# Altium footprint library TranDangKhoa-LIB.PcbLib: 1435 footprints (part 16 of 90)
Each footprint in its own frame and in the unit in brackets; x right, y up, seen from the top. Pads: shape width x height; smd on the part's side, far side on the other; paste and mask are expansions set on the pad; w line width, h text height; cw(c..) or ccw(c..) is an arc to the next point about the centre after c.
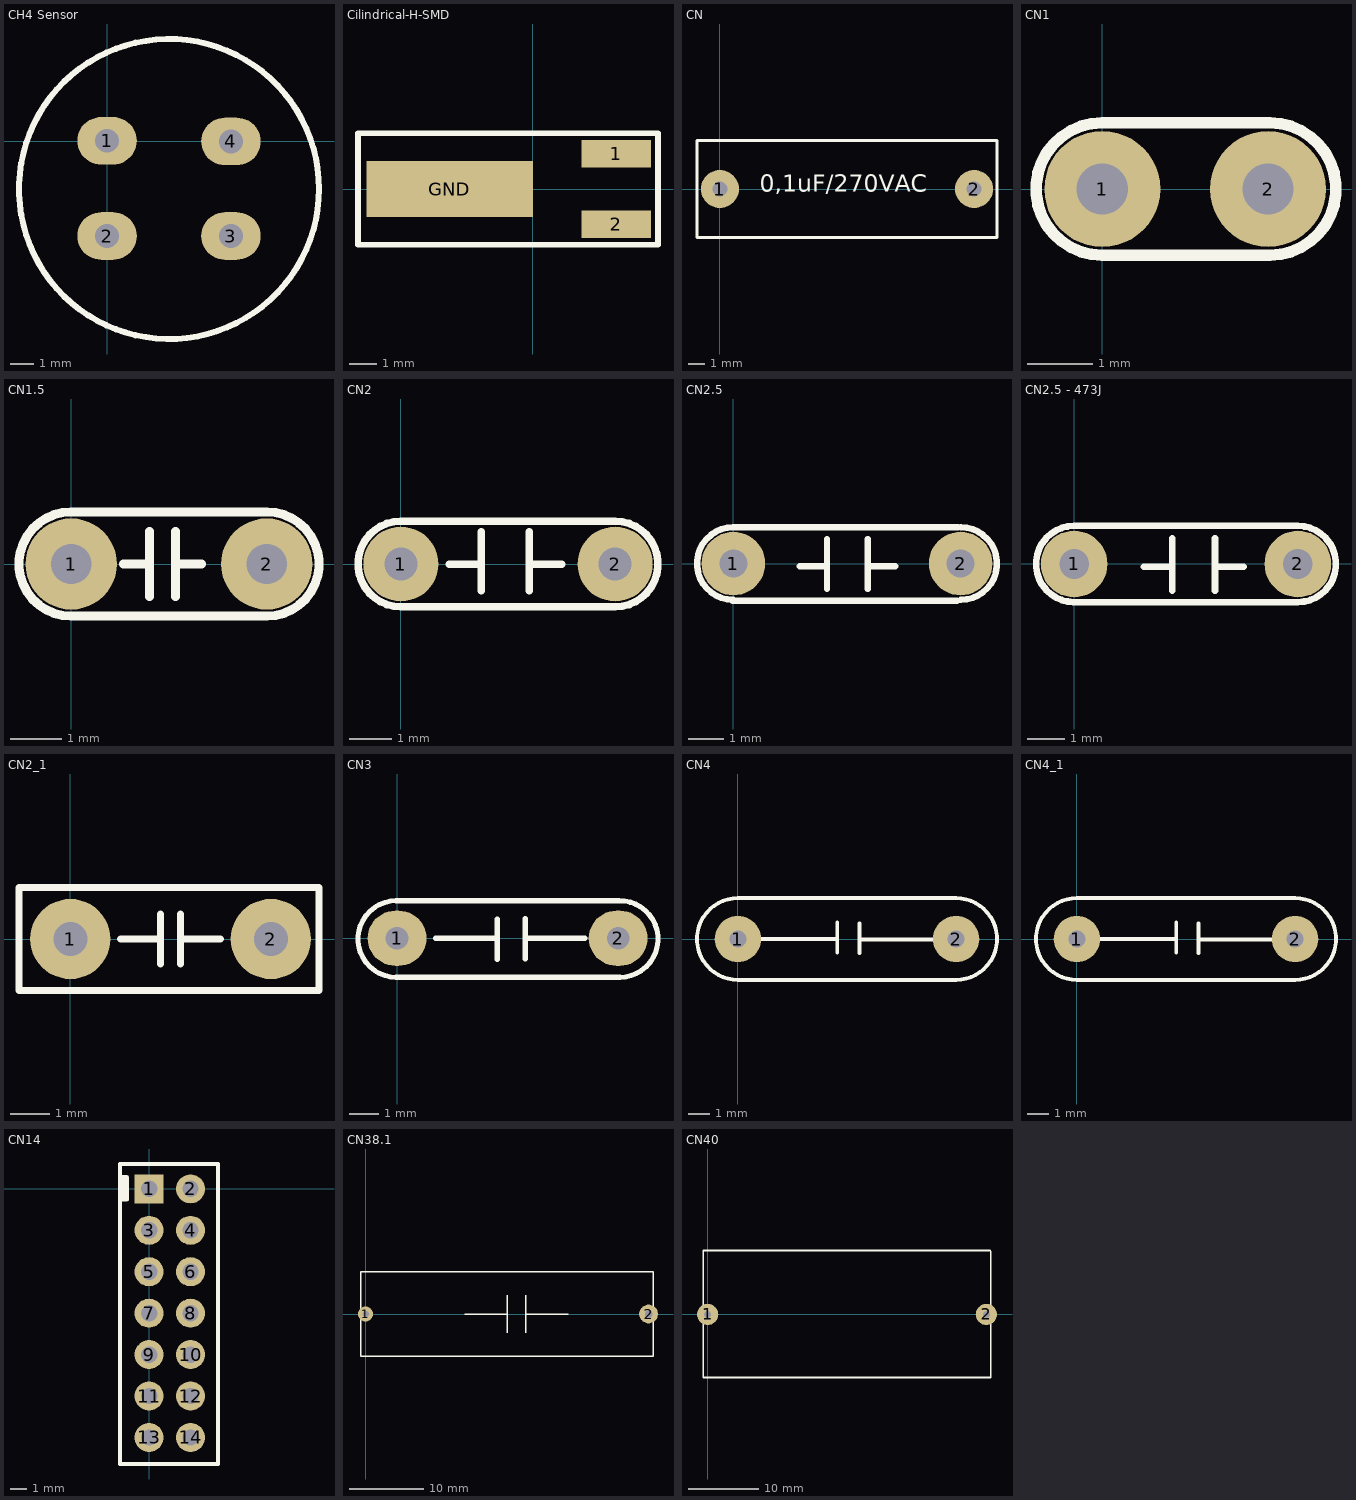
[diagram p15: the footprints below, top view; thin cyan lines are the x and y axes]

## CFAST_LOCKER [mm]
3D body "7E50-C016-00_STP.stp": height 9.7, standoff 1.42, extent -22.415,-19.247 24.815,29.371

## CH4 Sensor [mm]
pads (4):
  oval 2.5x2 hole 1: 1(0,0.025) 2(0,-3.975) 3(5.2,-3.975) 4(5.2,0)
Top Overlay:
  circle w0.254: c2.6,-2 r6.3

## Cilindrical-H-SMD [mm] "Cilindrical canned XTAL, Horizontal, SMD"
height 2
pads (3):
  rect 2.5x1 smd: 1(3,1.27) 2(3,-1.27)
  rect 6x2 smd: GND(-3,0)
Top Overlay:
  lines w0.2: -6.3,-2 4.5,-2 4.5,2 -6.3,2 -6.3,-2
3D body "Cilindrical.STEP": height 2.25, standoff 0.01, extent -5.4,-1.41 3.6,1.41

## CN [mil] "Tu loc 220"
height 100
pads (2):
  round 90 hole 35: 1(0,0) 2(600,0)
Top Overlay:
  lines w7: -54,-115 654,-115 654,115 -54,115 -54,-115
  text "0,1uF/270VAC" at 94,-21 h70
3D body "User Library-223K1600.STEP": height 787.4, standoff -196.85, extent -93.7,-157.48 693.7,157.49

## CN1 [mil]
height 200
pads (2):
  round 70 hole 31: 1(0,0) 2(100,0)
Top Overlay:
  lines w7: 100,-40 0,-40 cw(c0,0) 0,40 100,40 ; 101,-40 ccw(c101,0) 101,40
3D body "User Library-Cap 100n.step": height 265, standoff -46.85, extent -59.93,-30 169.93,36.79

## CN1.5 [mil]
height 200
pads (2):
  round 70 hole 31: 1(0,0) 2(150,0)
Top Overlay:
  lines w7: 40,0 60,0 ; 60,-25 60,25 ; 80,-25 80,25 ; 80,0 100,0 ; 0,-40 cw(c0,0) 0,40 150,40 cw(c150,0) 150,-40 0,-40
3D body "User Library-Ceramic Capacitor 5x3_75mm.STEP": height 254.27, standoff -98.43, extent -21.79,-38.74 171.79,40

## CN2 [mil]
height 200
pads (2):
  round 70 hole 31: 1(0,0) 2(200,0)
Top Overlay:
  lines w7: 45,0 75,0 ; 75,-25 75,30 ; 120,-25 120,30 ; 120,0 150,0 ; 0,-40 cw(c0,0) 0,40 200,40 cw(c200,0) 200,-40 0,-40
3D body "tu hoa 5mm.step": height 407.48, standoff -87.28, extent -54.48,-44.22 260.48,54.6

## CN2.5 [mil] "Tu pin to pin 250mil"
height 200
pads (2):
  round 70 hole 31: 1(0,0) 2(250,0)
Top Overlay:
  lines w7: -1,-41 246,-41 ; 0,-40 cw(c0,0) 0,40 247,40 ; 73,-3 103,-3 ; 103,-28 103,27 ; 148,-28 148,27 ; 148,-3 178,-3 ; 250,-40 ccw(c250,0) 250,40
3D body "User Library-RAD-0_1.STEP": height 248.03, standoff -78.74, extent -32.28,-51.18 278.74,51.18

## CN2.5 - 473J [mil] "Tu pin to pin 250mil"
height 200
pads (2):
  round 70 hole 31: 1(0,0) 2(235,0)
Top Overlay:
  lines w7: -1,-40.02 235,-40.02 ccw(c235,0) 235,40 0,40 ccw(c0,0) 0,-40 ; 73,-3 103,-3 ; 103,-28 103,27 ; 148,-28 148,27 ; 148,-3 178,-3
3D body "User Library-Film Capacitor 6x8mm.STEP": height 538.62, standoff -130.41, extent -39.37,-78.74 275.59,78.74

## CN2_1 [mil]
pads (2):
  round 80 hole 34: 1(0,0) 2(200,0)
Top Overlay:
  lines w7: 50,0 60,0 90,0 ; 90,-25 90,25 ; 90,-15 90,15 ; 110,-25 110,25 ; 110,-15 110,15 ; 110,0 140,0 150,0 ; -51.18,-51.18 -51.18,51.18 248.03,51.18 248.03,-51.18 -51.18,-51.18
3D body "User Library-100n.STEP": height 349.21, standoff -131.1, extent -49.21,-49.21 246.07,49.22

## CN3 [mil] "Cap np W 0.3"
height 200
pads (2):
  oval 80x75 hole 31: 1(0,0) 2(300,0)
Top Overlay:
  lines w7: -1,-53 cw(c-1,-1) -1,51 ; 0,51 300,51 ; 1,-53 300,-53 ; 52,0 136,0 ; 136,-29 136,26 ; 174,-28 174,27 ; 174,0 255,0 ; 300.96,50.99 cw(c302,-1) 302,-53
3D body "User Library-Panasonic ECK-A3D102KBP.step": height 419.15, standoff -100, extent -7.5,-47.04 307.5,47.16

## CN4 [mil] "Cap np W 0.4"
height 200
pads (2):
  round 85 hole 31: 1(0,0) 2(400,0)
Top Overlay:
  lines w7: 44,0 182,0 ; 182,-25 182,30 ; 223,-26 223,29 ; 223,-1 360,-1 ; 399,75 0,75 ccw(c0,0) 0,-75 400,-75 ccw(c400,0) 400,75
3D body "User Library-Kondensator_5mm.STEP": height 590.55, standoff -131.06, extent -36.22,-50 436.22,48.43

## CN4_1 [mil] "Cap np W 0.4"
height 200
pads (2):
  round 85 hole 31: 1(0,0) 2(400,0)
Top Overlay:
  lines w7: 44,0 182,0 ; 182,-25 182,30 ; 223,-26 223,29 ; 223,-1 360,-1 ; 399,75 0,75 ccw(c0,0) 0,-75 400,-75 ccw(c400,0) 400,75
3D body "SW3dPS-Cap 10n - 630V Poly_2009.STEP": height 480, standoff -68.11, extent -50.2,-94.49 451.77,92.56

## CN14 [mil]
pads (14):
  rect 70x70 hole 39.37 unplated: 1(0,0)
  round 70 hole 39.37 unplated: 2(100,0) 3(0,-100) 4(100,-100) 5(0,-200) 6(100,-200) 7(0,-300) 8(100,-300) 9(0,-400) 10(100,-400) 11(0,-500) 12(100,-500) 13(0,-600) 14(100,-600)
Top Overlay:
  lines w10: -70,-26 -62,-26 ; -70,28 -62,28 ; -62,-26 -54,-26 -54,28 -62,28 ; -62,-26 -62,28 ; -70,-664 -70,60 0,60 166,60 166,-664 -70,-664

## CN38.1 [mil]
pads (2):
  round 80 hole 34: 1(0,0)
  round 100 hole 40: 2(1500,0)
Top Overlay:
  lines w7: 525,0 750,0 ; 750,-100 750,100 ; 850,-100 850,100 ; 850,0 1075,0 ; -25,-225 1525,-225 1525,225 -25,225 -25,-225
3D body "User Library-Capacitor Axial 15.STEP": height 466.54, standoff -84.65, extent -13.77,-216.53 1513.79,216.54

## CN40 [mil]
pads (2):
  round 120 hole 40: 1(0,0) 2(1570,0)
Top Overlay:
  lines w7: 1590,360 1595,355
  lines w10: 1590,360 -25,360 -25,-355 1595,-355 1595,355
3D body "User Library-ICEL CAP.STEP": height 754.33, standoff -190.55, extent -23,-353.33 1591.17,355.33